# Altium footprint library PcbLib_ICs.PcbLib: 317 footprints (part 2 of 24) (continued)
## DFN-6 [mm]
height 0.75
pads (7):
  rect 0.3x0.75 smd paste+0 mask+0.05: 1(-0.5,-1.575)
  oval 0.3x0.75 smd paste+0 mask+0.05: 2(0,-1.575) 3(0.5,-1.575) 4(0.5,1.575) 5(0,1.575) 6(-0.5,1.575)
  rrect10% 1.4x1.7 smd paste-5 mask+0.05: EP(0,0)
via -0.35,-0.5 diameter 0.7 hole 0.3
via 0.35,-0.5 diameter 0.7 hole 0.3
via -0.35,0.5 diameter 0.7 hole 0.3
via 0.35,0.5 diameter 0.7 hole 0.3
Top Overlay:
  circle w0.25: c-1.625,-1.5 r0.125
  lines w0.2: -1.025,-1.7 -1.2,-1.7 -1.2,1.7 -1.025,1.7 ; 1.025,-1.7 1.2,-1.7 1.2,-0.275 ; 1.025,1.7 1.2,1.7 1.2,-0.325
Top Paste:
  rectangle: -0.7,0.1 -0.1,0.7
  rectangle: 0.1,0.1 0.7,0.7
  rectangle: -0.7,-0.7 -0.1,-0.1
  rectangle: 0.1,-0.7 0.7,-0.1
Bottom Solder:
  region: -1,1.1 1,1.1 1,0.3 0.7,0 1,-0.3 1,-1.1 -1,-1.1 -1,-0.3 -0.7,0 -1,0.3
Top Assy:
  circle w0.05: c-0.7,-1.2 r0.15
  lines w0.05: -0.62,-1.55 -0.62,-1.675 -0.37,-1.675 -0.37,-1.55 ; -0.62,1.55 -0.62,1.675 -0.37,1.675 -0.37,1.55 ; -0.12,-1.55 -0.12,-1.675 0.13,-1.675 0.13,-1.55 ; -0.12,1.55 -0.12,1.675 0.13,1.675 0.13,1.55 ; 0.38,-1.55 0.38,-1.675 0.63,-1.675 0.63,-1.55 ; 0.38,1.55 0.38,1.675 0.63,1.675 0.63,1.55 ; -1.05,-1.55 1.05,-1.55 1.05,1.55 -1.05,1.55 -1.05,-1.55
  text ".Designator" at 0.35,-2.579 h1.5
Top Text:
  lines w0.05: -1.95,-2.45 1.95,-2.45 1.95,2.45 -1.95,2.45 -1.95,-2.45
  lines w0.1: -0.5,0 0.5,0 ; 0,-0.5 0,0.5
3D body "User Library-My-DFN-6-2x3-0_5.STEP": height 0.8, standoff 0, extent -1.05,-1.56 1.05,1.56

## DFN-8(2x2mm) [mm]
height 0.75
pads (9):
  rect 0.25x0.8 smd paste+0 mask+0.05: 1(-0.75,-0.875)
  oval 0.25x0.7 smd paste+0 mask+0.05: 2(-0.25,-0.925) 3(0.25,-0.925) 4(0.75,-0.925) 5(0.75,0.925) 6(0.25,0.925) 7(-0.25,0.925) 8(-0.75,0.925)
  rect 1.6x0.25 smd mask+0.05: EP(0,0)
Top Overlay:
  circle w0.2: c-0.75,-1.625 r0.1
Top Assy:
  circle w0.05: c-0.7,-0.7 r0.1
  lines w0.05: -1,-1 -1,1 1,1 1,-1 -1,-1
  text ".Designator" at -2.579,-0.349 h1.5
Top Text:
  lines w0.1: -0.5,0 0.5,0 ; 0,-0.5 0,0.5
3D body "DFN-8(2x2).STEP": height 0.75, standoff 0, extent -1,-1.025 1,1.025

## DFN-8(3x3mm) [mm]
height 0.75
pads (9):
  rect 0.25x0.7 smd paste+0 mask+0.05: 1(-0.75,-1.4)
  oval 0.25x0.7 smd paste+0 mask+0.05: 2(-0.25,-1.4) 3(0.25,-1.4) 4(0.75,-1.4) 5(0.75,1.4) 6(0.25,1.4) 7(-0.25,1.4) 8(-0.75,1.4)
  rect 2.38x1.65 smd paste-3 mask+0.05: EP(0,0)
via -0.8,-0.4 diameter 0.7 hole 0.3
via -0.8,0.4 diameter 0.7 hole 0.3
via 0.8,-0.4 diameter 0.7 hole 0.3
via 0.8,0.4 diameter 0.7 hole 0.3
via 0,-0.4 diameter 0.7 hole 0.3
via 0,0.4 diameter 0.7 hole 0.3
Top Overlay:
  circle w0.25: c-0.75,-2.25 r0.125
  lines w0.2: -1.2,-1.7 -1.7,-1.7 -1.7,1.7 -1.2,1.7 ; 1.2,-1.7 1.7,-1.7 1.7,1.7 1.2,1.7
Top Paste:
  rectangle: -1.1,0.1 -0.5,0.7
  rectangle: -1.1,-0.7 -0.5,-0.1
  rectangle: -0.3,0.1 0.3,0.7
  rectangle: 0.5,0.1 1.1,0.7
  rectangle: -0.3,-0.7 0.3,-0.1
  rectangle: 0.5,-0.7 1.1,-0.1
Bottom Solder:
  region: -1.3,-1 -1.3,-0.2 -1.1,0 -1.3,0.2 -1.3,1 -0.2,1 0,0.8 0.2,1 1.3,1 1.3,0.2 1.1,0 1.3,-0.2 1.3,-1 0.2,-1 0,-0.8 -0.2,-1
Top Assy:
  circle w0.05: c-1,-1 r0.26
  lines w0.05: -1.5,-1.5 1.5,-1.5 1.5,1.5 -1.5,1.5 -1.5,-1.5
  text ".Designator" at -2.579,-0.349 h1.5
Top Text:
  lines w0.05: -1.6,-1.9 1.6,-1.9 1.6,1.9 -1.6,1.9 -1.6,-1.9
  lines w0.1: -0.5,0 0.5,0 ; 0,-0.5 0,0.5
3D body "DFN8(3x3).STEP": height 0.8, standoff 0, extent -1.5,-1.51 1.5,1.51

## DFN-8(LINEAR) [mm] "DFN-8 package 3x2mm with 0.5 mm pitch"
height 0.75
pads (9):
  rect 0.25x0.6 smd mask+0.06: 1(-0.75,-1.05)
  oval 0.25x0.6 smd mask+0.06: 2(-0.25,-1.05) 3(0.25,-1.05) 4(0.75,-1.05) 5(0.75,1.05) 6(0.25,1.05) 7(-0.25,1.05) 8(-0.75,1.05)
  rrect10% 2.15x0.56 smd paste-5 mask+0.06: EP(0,0)
via -0.8,0 diameter 0.7 hole 0.3
via 0.8,0 diameter 0.7 hole 0.3
via 0,0 diameter 0.7 hole 0.3
Top Overlay:
  circle w0.25: c-1.5,-1.75 r0.125
  lines w0.2: -1.275,-1.2 -1.7,-1.2 -1.7,1.2 -1.275,1.2 ; 1.275,-1.2 1.7,-1.2 1.7,1.2 1.275,1.2
Top Paste:
  rectangle: -0.9,-0.3 -0.1,0.3
  region: 0.9,0.3 0.1,0.3 0.1,-0.3 0.9,-0.3
Bottom Solder:
  region: -1.4,0.7 1.4,0.7 1.4,0.3 1.1,0 1.4,-0.3 1.4,-0.7 -1.4,-0.7 -1.4,-0.3 -1.1,0 -1.4,0.3
Top Assy:
  circle w0.05: c-1.25,-0.75 r0.15
  lines w0.05: -0.88,-1.055 -0.88,-1.15 -0.63,-1.15 -0.63,-1.055 ; -0.87,1.055 -0.87,1.15 -0.62,1.15 -0.62,1.055 ; -0.38,-1.055 -0.38,-1.15 -0.13,-1.15 -0.13,-1.055 ; -0.37,1.055 -0.37,1.15 -0.12,1.15 -0.12,1.055 ; 0.12,-1.055 0.12,-1.15 0.37,-1.15 0.37,-1.055 ; 0.13,1.055 0.13,1.15 0.38,1.15 0.38,1.055 ; 0.62,-1.055 0.62,-1.15 0.87,-1.15 0.87,-1.055 ; 0.63,1.055 0.63,1.15 0.88,1.15 0.88,1.055 ; -1.55,-1.05 1.55,-1.05 1.55,1.05 -1.55,1.05 -1.55,-1.05
  text ".Designator" at -2.579,-0.349 h1.5
Top Text:
  lines w0.05: -2.1,-1.6 2.1,-1.6 2.1,1.6 -2.1,1.6 -2.1,-1.6
  lines w0.1: -0.5,0 0.5,0 ; 0,-0.5 0,0.5
3D body "User Library-My-DFN-8-3x2-0_5.STEP": height 0.8, standoff 0, extent -1.55,-1.06 1.55,1.06

## DFN-10 [mm] "DFN-10 package with 0.5mm pitch"
height 0.75
pads (11):
  rect 0.7x0.25 smd paste+0 mask+0.07: 1(-1.575,1)
  oval 0.7x0.25 smd paste+0 mask+0.07: 2(-1.575,0.5) 3(-1.575,0) 4(-1.575,-0.5) 5(-1.575,-1) 6(1.575,-1) 7(1.575,-0.5) 8(1.575,0) 9(1.575,0.5) 10(1.575,1)
  rrect10% 1.65x2.38 smd paste-10 mask+0.05: EP(0,0)
via 0,0 diameter 0.7 hole 0.3
via -0.4,0.8 diameter 0.7 hole 0.3
via 0.4,0.8 diameter 0.7 hole 0.3
via 0.4,-0.8 diameter 0.7 hole 0.3
via -0.4,-0.8 diameter 0.7 hole 0.3
Top Overlay:
  circle w0.25: c-2.35,1.55 r0.125
  lines w0.2: -1.7,-1.525 -1.7,-1.7 1.7,-1.7 1.7,-1.525 ; -1.7,1.525 -1.7,1.7 1.7,1.7 1.7,1.525
Top Paste:
  region: 0.7,-0.5 0.1,-0.5 0.1,-1.1 0.7,-1.1
  region: -0.1,-0.5 -0.7,-0.5 -0.7,-1.1 -0.1,-1.1
  rectangle: -0.7,0.5 -0.1,1.1
  rectangle: 0.1,0.5 0.7,1.1
  rectangle: -0.7,-0.3 -0.1,0.3
  rectangle: 0.1,-0.3 0.7,0.3
Bottom Solder:
  region: -1,1.6 -0.3,1.6 0,1.3 0.3,1.6 1,1.6 1,0.3 0.7,0 1,-0.3 1,-1.6 0.3,-1.6 0,-1.3 -0.3,-1.6 -1,-1.6 -1,-0.3 -0.7,0 -1,0.3
Top Assy:
  circle w0.05: c-1.25,1.25 r0.15
  lines w0.05: -1.55,-1.12 -1.675,-1.12 -1.675,-0.87 -1.55,-0.87 ; -1.55,-0.62 -1.675,-0.62 -1.675,-0.37 -1.55,-0.37 ; -1.55,-0.12 -1.675,-0.12 -1.675,0.13 -1.55,0.13 ; -1.55,0.38 -1.675,0.38 -1.675,0.63 -1.55,0.63 ; -1.55,0.88 -1.675,0.88 -1.675,1.13 -1.55,1.13 ; 1.55,-1.12 1.675,-1.12 1.675,-0.87 1.55,-0.87 ; 1.55,-0.62 1.675,-0.62 1.675,-0.37 1.55,-0.37 ; 1.55,-0.12 1.675,-0.12 1.675,0.13 1.55,0.13 ; 1.55,0.38 1.675,0.38 1.675,0.63 1.55,0.63 ; 1.55,0.88 1.675,0.88 1.675,1.13 1.55,1.13 ; -1.55,-1.55 1.55,-1.55 1.55,1.55 -1.55,1.55 -1.55,-1.55
  text ".Designator" at -3.443,-0.467 h2
Top Text:
  lines w0.05: -1.85,-1.85 1.85,-1.85 1.85,1.85 -1.85,1.85 -1.85,-1.85
  lines w0.1: -0.5,0 0.5,0 ; 0,-0.5 0,0.5
3D body "User Library-My-DFN-10-3x3-0_5.STEP": height 0.8, standoff 0, extent -1.56,-1.55 1.56,1.55

## DFN-12(3x4) [mm] "DFN-12 package with 0.5mm pitch 3x4mm"
height 0.75
pads (13):
  rect 0.7x0.25 smd paste+0 mask+0.05: 1(-1.45,1.25)
  oval 0.7x0.25 smd paste+0 mask+0.05: 2(-1.45,0.75) 3(-1.45,0.25) 4(-1.45,-0.25) 5(-1.45,-0.75) 6(-1.45,-1.25) 7(1.45,-1.25) 8(1.45,-0.75) 9(1.45,-0.25) 10(1.45,0.25) 11(1.45,0.75) 12(1.45,1.25)
  rrect10% 1.7x3.3 smd paste-10 mask+0.05: EP(0,0)
via 0,0 diameter 0.7 hole 0.3
via -0.4,0.8 diameter 0.7 hole 0.3
via 0.4,0.8 diameter 0.7 hole 0.3
via 0.4,-0.8 diameter 0.7 hole 0.3
via -0.4,-0.8 diameter 0.7 hole 0.3
Top Overlay:
  circle w0.25: c-2.35,1.55 r0.125
  lines w0.2: -1.7,-1.7 -1.7,-2.2 1.7,-2.2 1.7,-1.7 ; -1.7,1.7 -1.7,2.2 1.7,2.2 1.7,1.7
Top Paste:
  region: 0.7,-0.9 0.1,-0.9 0.1,-1.5 0.7,-1.5
  region: -0.1,-0.9 -0.7,-0.9 -0.7,-1.5 -0.1,-1.5
  region: 0.7,-0.1 0.1,-0.1 0.1,-0.7 0.7,-0.7
  region: -0.1,-0.1 -0.7,-0.1 -0.7,-0.7 -0.1,-0.7
  rectangle: -0.7,0.9 -0.1,1.5
  rectangle: 0.1,0.9 0.7,1.5
  rectangle: -0.7,0.1 -0.1,0.7
  rectangle: 0.1,0.1 0.7,0.7
Bottom Solder:
  region: -1,1.8 -0.3,1.8 0,1.5 0.3,1.8 1,1.8 1,0.3 0.7,0 1,-0.3 1,-1.8 0.3,-1.8 0,-1.5 -0.3,-1.8 -1,-1.8 -1,-0.3 -0.7,0 -1,0.3
Top Assy:
  circle w0.05: c-1,1.5 r0.15
  circle w0.05: c-1,1.5 r0.2
  lines w0.05: -1.5,-1.365 -1.501,-1.365 -1.501,-1.135 -1.5,-1.135 ; -1.5,-0.865 -1.501,-0.865 -1.501,-0.635 -1.5,-0.635 ; -1.5,-0.365 -1.501,-0.365 -1.501,-0.135 -1.5,-0.135 ; -1.5,0.135 -1.501,0.135 -1.501,0.365 -1.5,0.365 ; -1.5,0.635 -1.501,0.635 -1.501,0.865 -1.5,0.865 ; -1.5,1.135 -1.501,1.135 -1.501,1.365 -1.5,1.365 ; 1.5,-1.365 1.501,-1.365 1.501,-1.135 1.5,-1.135 ; 1.5,-0.865 1.501,-0.865 1.501,-0.635 1.5,-0.635 ; 1.5,-0.365 1.501,-0.365 1.501,-0.135 1.5,-0.135 ; 1.5,0.135 1.501,0.135 1.501,0.365 1.5,0.365 ; 1.5,0.635 1.501,0.635 1.501,0.865 1.5,0.865 ; 1.5,1.135 1.501,1.135 1.501,1.365 1.5,1.365 ; -1.5,-2 -1.5,2 1.5,2 1.5,-2 -1.5,-2
  text ".Designator" at 0.467,-3.443 h2
Top Text:
  lines w0.05: -1.85,-2.1 1.85,-2.1 1.85,2.1 -1.85,2.1 -1.85,-2.1
  lines w0.1: -0.5,0 0.5,0 ; 0,-0.5 0,0.5
3D body "DFN12(3x4).step": height 0.76, standoff 0, extent -1.501,-2 1.501,2

## DIP-4_SMD [mm] "FAIRCHILD"
height 4
pads (4):
  rect 1.8x1.6 smd mask+0.065: 1(-4.587,1.27)
  rrect50% 1.8x1.6 smd mask+0.065: 2(-4.612,-1.27) 3(4.587,-1.27) 4(4.612,1.27)
Top Overlay:
  circle w0.2: c-2.75,1.25 r0.3
  circle w0.6: c-5,3 r0.3
  rectangle: -3.8,2.7 -3.141,3.2
  lines w0.2: -3.7,-2.25 -3.7,-2.75 3.7,-2.75 3.7,-2.25 ; -3.7,2.35 -3.7,2.75 3.7,2.75 3.7,2.25
Top Assy:
  lines w0.05: -4.027,-1.616 -4.083,-1.92 -4.348,-1.92 ; -4.027,1.616 -4.083,1.92 -4.348,1.92 ; 4.027,-1.616 4.083,-1.92 4.347,-1.92 ; 4.027,1.616 4.083,1.92 4.347,1.92 ; -4.725,-1.92 -4.528,-1.92 ; -4.725,-1.92 -5.23,-1.92 -5.23,-0.62 -4.725,-0.62 ; -4.725,-1.92 -4.725,-0.62 ; -4.725,-0.62 -4.528,-0.62 ; -4.725,0.62 -4.528,0.62 ; -4.725,0.62 -5.23,0.62 -5.23,1.92 -4.725,1.92 ; -4.725,0.62 -4.725,1.92 ; -4.725,1.92 -4.528,1.92 ; -4.528,-1.92 -4.348,-1.92 ; -4.528,-1.92 -4.528,-0.62 ; -4.528,-0.62 -4.157,-0.62 ; -4.528,0.62 -4.157,0.62 ; -4.528,0.62 -4.528,1.92 ; -4.528,1.92 -4.348,1.92 ; -4.348,-1.92 -4.291,-1.616 -4.157,-1.616 ; -4.348,1.92 -4.291,1.616 -4.157,1.616 ; -4.157,-1.616 -3.96,-1.616 ; -4.157,-1.616 -4.157,-0.62 ; -4.157,-0.62 -3.96,-0.62 ; -4.157,0.62 -3.96,0.62 ; -4.157,0.62 -4.157,1.616 ; -4.157,1.616 -3.96,1.616 ; -3.96,-1.616 -3.5,-1.616 ; -3.96,-1.616 -3.96,-0.62 ; -3.96,-0.62 -3.5,-0.62 ; -3.96,0.62 -3.5,0.62 ; -3.96,0.62 -3.96,1.616 ; -3.96,1.616 -3.5,1.616 ; -3.5,-2.55 3.5,-2.55 ; -3.5,-2.55 -3.215,-2.265 ; -3.5,-2.55 -3.5,-1.616 ; -3.5,-1.616 -3.5,-0.62 ; -3.5,-0.62 -3.5,0.62 ; -3.5,0.62 -3.5,1.616 ; -3.5,1.616 -3.5,2.55 ; -3.5,2.55 -3.215,2.265 ; -3.5,2.55 3.5,2.55 ; -3.215,-2.265 -2.17,-2.265 ; -3.215,-2.265 -3.215,2.265 ; -3.215,2.265 -2.17,2.265 ; -2.17,-2.265 -2.068,-2.197 ; -2.17,-2.265 -2.17,2.265 ; -2.17,2.265 -2.068,2.197 ; -2.068,-2.197 3.147,-2.197 ; -2.068,-2.197 -2.068,2.197 ; -2.068,2.197 3.147,2.197 ; 3.147,-2.197 3.147,2.197 ; 3.147,-2.197 3.5,-2.55 ; 3.147,2.197 3.5,2.55 ; 3.5,-2.55 3.5,-1.616 ; 3.5,-1.616 3.5,-0.62 ; 3.5,-1.616 3.96,-1.616 ; 3.5,-0.62 3.5,0.62 ; 3.5,-0.62 3.96,-0.62 ; 3.5,0.62 3.5,1.616 ; 3.5,0.62 3.96,0.62 ; 3.5,1.616 3.5,2.55 ; 3.5,1.616 3.96,1.616 ; 3.96,-1.616 4.157,-1.616 ; 3.96,-1.616 3.96,-0.62 ; 3.96,-0.62 4.157,-0.62 ; 3.96,0.62 4.157,0.62 ; 3.96,0.62 3.96,1.616 ; 3.96,1.616 4.157,1.616 ; 4.157,-1.616 4.291,-1.616 4.347,-1.92 ; 4.157,-1.616 4.157,-0.62 ; 4.157,-0.62 4.528,-0.62 ; 4.157,0.62 4.528,0.62 ; 4.157,0.62 4.157,1.616 ; 4.157,1.616 4.291,1.616 4.347,1.92 ; 4.347,-1.92 4.528,-1.92 ; 4.347,1.92 4.528,1.92 ; 4.528,-1.92 4.725,-1.92 ; 4.528,-1.92 4.528,-0.62 ; 4.528,-0.62 4.725,-0.62 ; 4.528,0.62 4.725,0.62 ; 4.528,0.62 4.528,1.92 ; 4.528,1.92 4.725,1.92 ; 4.725,-1.92 5.23,-1.92 5.23,-0.62 4.725,-0.62 ; 4.725,-1.92 4.725,-0.62 ; 4.725,0.62 5.23,0.62 5.23,1.92 4.725,1.92 ; 4.725,0.62 4.725,1.92
  text ".Designator" at -5.157,-0.706 h3
Top Text:
  lines w0.1: -0.5,0 0.5,0 ; 0,-0.5 0,0.5
3D body "FOD817.step": height 4.6, standoff 0, extent -5.23,-2.55 5.23,2.55

## DIP-4P [mm] "Plastic DIP, 4 pin, lead pitch 2.54mm (0.1\"), row spacing 7.62mm (0.3\")."
height 1.75
pads (4):
  rect 2.5x1.5 hole 0.8 mask+0.075: 1(-3.81,1.27)
  oval 2.5x1.5 hole 0.8 mask+0.075: 2(-3.81,-1.27) 3(3.81,-1.27) 4(3.81,1.27)
Top Overlay:
  circle w0.6: c-4,3.21 r0.3
  lines w0.2: -1.016,2.26 ccw(c0,2.26) 1.016,2.26 ; -2.2,-2.26 -2.2,2.26 2.2,2.26 2.2,-2.26 -2.2,-2.26
Top Assy:
  circle w0.05: c-2.244,1.391 r0.25
  lines w0.05: -3.247,-1.895 -3.247,-2.097 ; -3.247,-0.645 -3.247,0.645 ; -3.247,1.895 -3.247,2.097 ; -3.244,-1.895 -3.244,-2.097 ; -3.244,-0.645 -3.244,0.645 ; -3.244,1.895 -3.244,2.097 ; 3.244,-1.895 3.244,-2.097 ; 3.244,-0.645 3.244,0.645 ; 3.244,1.895 3.244,2.097 ; 3.247,-1.895 3.247,-2.097 ; 3.247,-0.645 3.247,0.645 ; 3.247,1.895 3.247,2.097 ; -3.735,-1.895 -3.935,-1.895 -3.935,-0.645 -3.735,-0.645 ; -3.735,-1.895 -3.228,-1.895 -3.228,-0.645 -3.735,-0.645 ; -3.735,-1.895 -3.735,-0.645 ; -3.735,0.645 -3.228,0.645 -3.228,1.895 -3.735,1.895 ; -3.735,0.645 -3.935,0.645 -3.935,1.895 -3.735,1.895 ; -3.735,0.645 -3.735,1.895 ; -3.247,-2.097 ccw(c-3.047,-2.097) -3.047,-2.297 ; -3.247,-2.097 -3.244,-2.097 ; -3.247,2.097 cw(c-3.047,2.097) -3.047,2.297 ; -3.247,2.097 -3.244,2.097 ; -3.244,-2.097 ccw(c-3.04,-2.09) -3.047,-2.294 ; -3.244,-2.097 -2.971,-1.824 ; -3.244,2.097 cw(c-3.04,2.09) -3.047,2.294 ; -3.244,2.097 -2.971,1.824 ; -3.047,-2.297 3.047,-2.297 ; -3.047,-2.297 -3.047,-2.294 ; -3.047,-2.294 -2.774,-2.021 ; -3.047,-2.294 3.047,-2.294 ; -3.047,2.294 -2.774,2.021 ; -3.047,2.294 3.047,2.294 ; -3.047,2.294 -3.047,2.297 ; -3.047,2.297 3.047,2.297 ; -2.971,-1.824 ccw(c-2.766,-1.816) -2.774,-2.021 ; -2.971,-1.824 -2.774,-1.824 ; -2.971,-1.824 -2.971,1.824 ; -2.971,1.824 cw(c-2.766,1.816) -2.774,2.021 ; -2.971,1.824 -2.774,1.824 ; -2.774,-2.021 -2.774,-1.824 ; -2.774,-2.021 2.774,-2.021 ; -2.774,-1.824 2.774,-1.824 ; -2.774,-1.824 -2.774,1.824 ; -2.774,1.824 -2.774,2.021 ; -2.774,1.824 2.774,1.824 ; -2.774,2.021 2.774,2.021 ; 2.774,-2.021 ccw(c2.766,-1.816) 2.971,-1.824 ; 2.774,-2.021 2.774,-1.824 ; 2.774,-2.021 3.047,-2.294 ; 2.774,-1.824 2.971,-1.824 ; 2.774,-1.824 2.774,1.824 ; 2.774,1.824 2.971,1.824 ; 2.774,1.824 2.774,2.021 ; 2.774,2.021 cw(c2.766,1.816) 2.971,1.824 ; 2.774,2.021 3.047,2.294 ; 2.971,-1.824 2.971,1.824 ; 2.971,-1.824 3.244,-2.097 ; 2.971,1.824 3.244,2.097 ; 3.047,-2.297 ccw(c3.047,-2.097) 3.247,-2.097 ; 3.047,-2.297 3.047,-2.294 ; 3.047,-2.294 ccw(c3.04,-2.09) 3.244,-2.097 ; 3.047,2.294 cw(c3.04,2.09) 3.244,2.097 ; 3.047,2.294 3.047,2.297 ; 3.047,2.297 cw(c3.047,2.097) 3.247,2.097 ; 3.244,-2.097 3.247,-2.097 ; 3.244,2.097 3.247,2.097 ; 3.735,-1.895 3.935,-1.895 3.935,-0.645 3.735,-0.645 ; 3.735,-1.895 3.228,-1.895 3.228,-0.645 3.735,-0.645 ; 3.735,-1.895 3.735,-0.645 ; 3.735,0.645 3.935,0.645 3.935,1.895 3.735,1.895 ; 3.735,0.645 3.228,0.645 3.228,1.895 3.735,1.895 ; 3.735,0.645 3.735,1.895
  text ".Designator" at -5.162,-0.7 h3
Top Text:
  lines w0.05: -5.334,-2.45 -5.334,2.46 5.334,2.46 5.334,-2.45 -5.334,-2.45
  lines w0.1: -0.5,0 0.5,0 ; 0,-0.5 0,0.5
3D body "User Library-DIP4.step": height 3.95, standoff -2.35, extent -3.935,-2.297 3.935,2.297

## DIP-6P [mm] "Plastic DIP, 6 pin, lead pitch 2.54mm (0.1\"), row spacing 7.62mm (0.3\")."
height 1.75
pads (6):
  rect 2.5x1.5 hole 0.8 mask+0.075: 1(-3.81,2.54)
  oval 2.5x1.5 hole 0.8 mask+0.075: 2(-3.81,0) 3(-3.81,-2.54) 4(3.81,-2.54) 5(3.81,0) 6(3.81,2.54)
Top Overlay:
  circle w0.6: c-4,4.48 r0.3
  lines w0.2: -1.016,3.53 ccw(c0,3.53) 1.016,3.53 ; 2.2,-3.53 -2.2,-3.53 -2.2,3.53 2.2,3.53 2.2,-3.5
Top Assy:
  lines w0.05: -3.255,-3.14 -3.735,-3.14 ; -3.255,-1.94 -3.735,-1.94 ; -3.255,-0.6 -3.735,-0.6 ; -3.255,0.6 -3.735,0.6 ; -3.255,1.94 -3.735,1.94 ; -3.255,3.14 -3.735,3.14 ; 3.245,-3.14 3.735,-3.14 ; 3.245,-1.94 3.735,-1.94 ; 3.245,-0.6 3.735,-0.6 ; 3.245,0.6 3.735,0.6 ; 3.245,1.94 3.735,1.94 ; 3.245,3.14 3.735,3.14 ; -3.735,-3.14 -3.735,-1.94 ; -3.735,-3.14 -3.935,-3.14 -3.935,-1.94 -3.735,-1.94 ; -3.735,-0.6 -3.735,0.6 ; -3.735,-0.6 -3.935,-0.6 -3.935,0.6 -3.735,0.6 ; -3.735,1.94 -3.735,3.14 ; -3.735,1.94 -3.935,1.94 -3.935,3.14 -3.735,3.14 ; -3.255,-3.56 3.245,-3.56 ; -3.255,-3.56 -3.255,3.56 ; -3.255,-3.56 -2.955,-3.26 ; -3.255,3.56 3.245,3.56 ; -3.255,3.56 -2.955,3.26 ; -2.955,-3.26 2.945,-3.26 ; -2.955,-3.26 -2.955,3.26 ; -2.955,3.26 -0.923,3.26 ; -0.923,3.26 cw(c-0.125,3.2) -0.918,3.305 0.668,3.305 cw(c-0.125,3.2) 0.673,3.26 ; -0.923,3.26 ccw(c-0.125,3.2) 0.673,3.26 ; 0.673,3.26 2.945,3.26 ; 2.945,-3.26 2.945,3.26 ; 2.945,-3.26 3.245,-3.56 ; 2.945,3.26 3.245,3.56 ; 3.245,-3.56 3.245,3.56 ; 3.735,-3.14 3.735,-1.94 ; 3.735,-3.14 3.935,-3.14 3.935,-1.94 3.735,-1.94 ; 3.735,-0.6 3.735,0.6 ; 3.735,-0.6 3.935,-0.6 3.935,0.6 3.735,0.6 ; 3.735,1.94 3.735,3.14 ; 3.735,1.94 3.935,1.94 3.935,3.14 3.735,3.14
  text ".Designator" at 0.7,-5.162 h3
Top Text:
  lines w0.05: -5.334,-3.7 -5.334,3.73 5.334,3.73 5.334,-3.7 -5.334,-3.7
  lines w0.1: -0.5,0 0.5,0 ; 0,-0.5 0,0.5
3D body "User Library-DIP6.STEP": height 4.3, standoff -3, extent -3.935,-3.56 3.935,3.56

## DIP-6PW [mm] "White Plastic DIP, 6 pin, lead pitch 2.54mm (0.1\"), row spacing 7.62mm (0.3\")."
height 1.75
pads (6):
  rect 2.5x1.5 hole 0.8 mask+0.075: 1(-3.81,2.54)
  oval 2.5x1.5 hole 0.8 mask+0.075: 2(-3.81,0) 3(-3.81,-2.54) 4(3.81,-2.54) 5(3.81,0) 6(3.81,2.54)
Top Overlay:
  circle w0.6: c-4,4.48 r0.3
  lines w0.2: -1.016,3.53 ccw(c0,3.53) 1.016,3.53 ; 2.2,-3.53 -2.2,-3.53 -2.2,3.53 2.2,3.53 2.2,-3.5
Top Assy:
  lines w0.05: -3.255,-3.14 -3.735,-3.14 ; -3.255,-1.94 -3.735,-1.94 ; -3.255,-0.6 -3.735,-0.6 ; -3.255,0.6 -3.735,0.6 ; -3.255,1.94 -3.735,1.94 ; -3.255,3.14 -3.735,3.14 ; 3.245,-3.14 3.735,-3.14 ; 3.245,-1.94 3.735,-1.94 ; 3.245,-0.6 3.735,-0.6 ; 3.245,0.6 3.735,0.6 ; 3.245,1.94 3.735,1.94 ; 3.245,3.14 3.735,3.14 ; -3.735,-3.14 -3.735,-1.94 ; -3.735,-3.14 -3.935,-3.14 -3.935,-1.94 -3.735,-1.94 ; -3.735,-0.6 -3.735,0.6 ; -3.735,-0.6 -3.935,-0.6 -3.935,0.6 -3.735,0.6 ; -3.735,1.94 -3.735,3.14 ; -3.735,1.94 -3.935,1.94 -3.935,3.14 -3.735,3.14 ; -3.255,-3.56 3.245,-3.56 ; -3.255,-3.56 -3.255,3.56 ; -3.255,-3.56 -2.955,-3.26 ; -3.255,3.56 3.245,3.56 ; -3.255,3.56 -2.955,3.26 ; -2.955,-3.26 2.945,-3.26 ; -2.955,-3.26 -2.955,3.26 ; -2.955,3.26 -0.923,3.26 ; -0.923,3.26 cw(c-0.125,3.2) -0.918,3.305 0.668,3.305 cw(c-0.125,3.2) 0.673,3.26 ; -0.923,3.26 ccw(c-0.125,3.2) 0.673,3.26 ; 0.673,3.26 2.945,3.26 ; 2.945,-3.26 2.945,3.26 ; 2.945,-3.26 3.245,-3.56 ; 2.945,3.26 3.245,3.56 ; 3.245,-3.56 3.245,3.56 ; 3.735,-3.14 3.735,-1.94 ; 3.735,-3.14 3.935,-3.14 3.935,-1.94 3.735,-1.94 ; 3.735,-0.6 3.735,0.6 ; 3.735,-0.6 3.935,-0.6 3.935,0.6 3.735,0.6 ; 3.735,1.94 3.735,3.14 ; 3.735,1.94 3.935,1.94 3.935,3.14 3.735,3.14
  text ".Designator" at 0.7,-5.162 h3
Top Text:
  lines w0.05: -5.334,-3.7 -5.334,3.73 5.334,3.73 5.334,-3.7 -5.334,-3.7
  lines w0.1: -0.5,0 0.5,0 ; 0,-0.5 0,0.5
3D body "DIP6-White.STEP": height 4.4, standoff -2.9, extent -3.935,-3.56 3.935,3.56

## DIP-8C [mm] "Plastic DIP, 7 pin, lead pitch 2.54mm (0.1\"), row spacing 7.62mm (0.3\")."
height 1.75
pads (7):
  rect 2.5x1.5 hole 0.8 mask+0.075: 1(-3.81,3.81)
  oval 2.5x1.5 hole 0.8 mask+0.075: 2(-3.81,1.27) 4(-3.81,-3.81) 5(3.81,-3.81) 6(3.81,-1.27) 7(3.81,1.27) 8(3.81,3.81)
Top Overlay:
  circle w0.6: c-4,5.75 r0.3
  lines w0.2: -1.016,4.8 ccw(c0,4.8) 1.016,4.8 ; -2.2,-4.8 -2.2,4.8 2.2,4.8 2.2,-4.8 -2.2,-4.8
Top Assy:
  lines w0.05: -3.1,-4.06 -3.41,-4.06 ; -3.1,-3.05 -3.41,-3.05 ; -3.1,0.51 -3.41,0.51 ; -3.1,2.03 -3.41,2.03 ; -3.1,3.05 -3.41,3.05 ; -3.1,4.06 -3.41,4.06 ; 3.1,-4.06 3.41,-4.06 ; 3.1,-3.05 3.41,-3.05 ; 3.1,-2.03 3.41,-2.03 ; 3.1,-0.51 3.41,-0.51 ; 3.1,0.51 3.41,0.51 ; 3.1,2.03 3.41,2.03 ; 3.1,3.05 3.41,3.05 ; 3.1,4.06 3.41,4.06 ; -3.41,-4.06 -3.41,-3.05 ; -3.41,-4.06 -3.935,-4.06 -3.935,-3.05 -3.41,-3.05 ; -3.41,0.51 -3.41,2.03 ; -3.41,0.51 -3.935,0.51 -3.935,2.03 -3.41,2.03 ; -3.41,3.05 -3.41,4.06 ; -3.41,3.05 -3.935,3.05 -3.935,4.06 -3.41,4.06 ; -3.1,-4.7 3.1,-4.7 ; -3.1,-4.7 -2.65,-4.25 ; -3.1,-4.7 -3.1,4.7 ; -3.1,4.7 -2.65,4.25 ; -3.1,4.7 3.1,4.7 ; -2.65,-4.25 -2.65,4.25 ; -2.65,-4.25 2.65,-4.25 ; -2.65,4.25 -1,4.25 ; -1,4.2 ccw(c0,4.2) 1,4.2 ; -1,4.2 -0.927,4.2 ; -1,4.2 -1,4.25 ; -1,4.25 -0.927,4.304 ; -0.927,4.2 ccw(c0,4.2) 0.927,4.2 ; -0.927,4.2 -0.927,4.304 ; -0.927,4.304 0.927,4.304 ; 0.927,4.2 1,4.2 ; 0.927,4.2 0.927,4.304 ; 0.927,4.304 1,4.25 ; 1,4.2 1,4.25 ; 1,4.25 2.65,4.25 ; 2.65,-4.25 3.1,-4.7 ; 2.65,-4.25 2.65,4.25 ; 2.65,4.25 3.1,4.7 ; 3.1,-4.7 3.1,4.7 ; 3.41,-4.06 3.41,-3.05 ; 3.41,-4.06 3.935,-4.06 3.935,-3.05 3.41,-3.05 ; 3.41,-2.03 3.41,-0.51 ; 3.41,-2.03 3.935,-2.03 3.935,-0.51 3.41,-0.51 ; 3.41,0.51 3.41,2.03 ; 3.41,0.51 3.935,0.51 3.935,2.03 3.41,2.03 ; 3.41,3.05 3.41,4.06 ; 3.41,3.05 3.935,3.05 3.935,4.06 3.41,4.06
  text ".Designator" at 0.7,-5.162 h3
Top Text:
  lines w0.05: -5.334,-5 -5.334,5 5.334,5 5.334,-5 -5.334,-5
  lines w0.1: -0.5,0 0.5,0 ; 0,-0.5 0,0.5
3D body "DIP-8C.STEP": height 4.36, standoff -3, extent -3.937,-4.7 3.933,4.7

## DIP-8P-M01 [mm] "Plastic DIP, 8 pin, lead pitch 2.54mm (0.1\"), row spacing 7.62mm (0.3\")."
height 1.75
pads (8):
  rect 2.5x1.5 hole 0.8 mask+0.075: 1(-3.81,3.81)
  oval 2.5x1.5 hole 0.8 mask+0.075: 2(-3.81,1.27) 3(-3.81,-1.27) 4(-3.81,-3.81) 5(3.81,-3.81) 6(3.81,-1.27) 7(3.81,1.27) 8(3.81,3.81)
Top Overlay:
  circle w0.6: c-4,5.75 r0.3
  lines w0.2: -1.016,4.8 ccw(c0,4.8) 1.016,4.8 ; -2.2,-4.8 -2.2,4.8 2.2,4.8 2.2,-4.8 -2.2,-4.8
Top Assy:
  lines w0.05: -3.1,-4.06 -3.41,-4.06 ; -3.1,-3.05 -3.41,-3.05 ; -3.1,-2.03 -3.41,-2.03 ; -3.1,-0.51 -3.41,-0.51 ; -3.1,0.51 -3.41,0.51 ; -3.1,2.03 -3.41,2.03 ; -3.1,3.05 -3.41,3.05 ; -3.1,4.06 -3.41,4.06 ; 3.1,-4.06 3.41,-4.06 ; 3.1,-3.05 3.41,-3.05 ; 3.1,-2.03 3.41,-2.03 ; 3.1,-0.51 3.41,-0.51 ; 3.1,0.51 3.41,0.51 ; 3.1,2.03 3.41,2.03 ; 3.1,3.05 3.41,3.05 ; 3.1,4.06 3.41,4.06 ; -3.41,-4.06 -3.41,-3.05 ; -3.41,-4.06 -3.935,-4.06 -3.935,-3.05 -3.41,-3.05 ; -3.41,-2.03 -3.41,-0.51 ; -3.41,-2.03 -3.935,-2.03 -3.935,-0.51 -3.41,-0.51 ; -3.41,0.51 -3.41,2.03 ; -3.41,0.51 -3.935,0.51 -3.935,2.03 -3.41,2.03 ; -3.41,3.05 -3.41,4.06 ; -3.41,3.05 -3.935,3.05 -3.935,4.06 -3.41,4.06 ; -3.1,-4.7 3.1,-4.7 ; -3.1,-4.7 -2.65,-4.25 ; -3.1,-4.7 -3.1,4.7 ; -3.1,4.7 -2.65,4.25 ; -3.1,4.7 3.1,4.7 ; -2.65,-4.25 -2.65,4.25 ; -2.65,-4.25 2.65,-4.25 ; -2.65,4.25 -1,4.25 ; -1,4.2 ccw(c0,4.2) 1,4.2 ; -1,4.2 -0.927,4.2 ; -1,4.2 -1,4.25 ; -1,4.25 -0.927,4.304 ; -0.927,4.2 ccw(c0,4.2) 0.927,4.2 ; -0.927,4.2 -0.927,4.304 ; -0.927,4.304 0.927,4.304 ; 0.927,4.2 1,4.2 ; 0.927,4.2 0.927,4.304 ; 0.927,4.304 1,4.25 ; 1,4.2 1,4.25 ; 1,4.25 2.65,4.25 ; 2.65,-4.25 3.1,-4.7 ; 2.65,-4.25 2.65,4.25 ; 2.65,4.25 3.1,4.7 ; 3.1,-4.7 3.1,4.7 ; 3.41,-4.06 3.41,-3.05 ; 3.41,-4.06 3.935,-4.06 3.935,-3.05 3.41,-3.05 ; 3.41,-2.03 3.41,-0.51 ; 3.41,-2.03 3.935,-2.03 3.935,-0.51 3.41,-0.51 ; 3.41,0.51 3.41,2.03 ; 3.41,0.51 3.935,0.51 3.935,2.03 3.41,2.03 ; 3.41,3.05 3.41,4.06 ; 3.41,3.05 3.935,3.05 3.935,4.06 3.41,4.06
  text ".Designator" at 0.7,-5.162 h3
Top Text:
  lines w0.05: -5.334,-5 -5.334,5 5.334,5 5.334,-5 -5.334,-5
  lines w0.1: -0.5,0 0.5,0 ; 0,-0.5 0,0.5
3D body "User Library-DIP-8P-M01.step": height 4.36, standoff -3, extent -3.937,-4.7 3.933,4.7